# Altium schematic symbol library jlcpcb_2025_04_resistors_extended_0201.schlib: 1508 symbols (part 6 of 8)
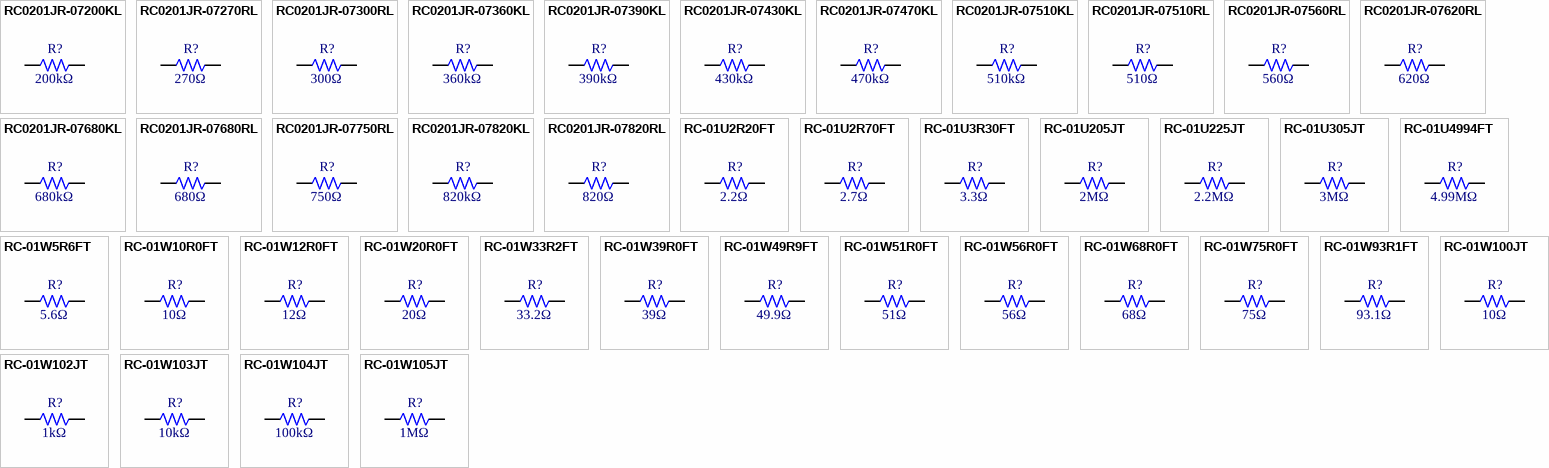
[diagram p42: symbols RC0201JR-07200KL to RC-01W105JT]

## RC-01U2R20FT
designator R?  Resistance: 2.2Ω  (hidden comment: *)
Resistor, 2.2Ω, ±1%, 50mW, ±400ppm/℃, -55℃~+125℃, SMD 0201; Manufacturer: Uniroyal; Manufacturer Part Number: RC-01U2R20FT; Supplier 1: LCSC; Supplier Part Number 1: C320468; JLCPCB Part Number: C320468; Power Rating: 50mW; Category: Resistors; Package Size: 0201; JLCPCB Basic Part: Yes; Tolerance: ±1%; Temperature Coefficient: ±400ppm/℃; Temperature Rating: -55℃~+125℃; ComponentLink1Description: Datasheet; ComponentLink1URL: https://wmsc.lcsc.com/wmsc/upload/file/pdf/v2/lcsc/2202211530_FH--Guangdong-Fenghua-Advanced-Tech-RC-01U2R20FT_C320468.pdf; ComponentLink2Description: JLCPCB Part URL; ComponentLink2URL: https://jlcpcb.com/partdetail/C320468
pins: 1, 2
1 alternate drawing of the same symbol

## RC-01U2R70FT
designator R?  Resistance: 2.7Ω  (hidden comment: *)
Resistor, 2.7Ω, ±1%, 50mW, 25V, ±400ppm/℃, -55℃~+155℃, SMD 0201; Manufacturer: Uniroyal; Manufacturer Part Number: RC-01U2R70FT; Supplier 1: LCSC; Supplier Part Number 1: C2991518; JLCPCB Part Number: C2991518; Power Rating: 50mW; Category: Resistors; Package Size: 0201; JLCPCB Basic Part: Yes; Tolerance: ±1%; Voltage Rating: 25V; Temperature Coefficient: ±400ppm/℃; Temperature Rating: -55℃~+155℃; ComponentLink1Description: Datasheet; ComponentLink1URL: https://wmsc.lcsc.com/wmsc/upload/file/pdf/v2/lcsc/2204111630_FH--Guangdong-Fenghua-Advanced-Tech-RC-01U2R70FT_C2991518.pdf; ComponentLink2Description: JLCPCB Part URL; ComponentLink2URL: https://jlcpcb.com/partdetail/C2991518
pins: 1, 2
1 alternate drawing of the same symbol

## RC-01U3R30FT
designator R?  Resistance: 3.3Ω  (hidden comment: *)
Resistor, 3.3Ω, ±1%, 50mW, 25V, ±400ppm/℃, -55℃~+125℃, SMD 0201; Manufacturer: Uniroyal; Manufacturer Part Number: RC-01U3R30FT; Supplier 1: LCSC; Supplier Part Number 1: C304495; JLCPCB Part Number: C304495; Power Rating: 50mW; Category: Resistors; Package Size: 0201; JLCPCB Basic Part: Yes; Tolerance: ±1%; Voltage Rating: 25V; Temperature Coefficient: ±400ppm/℃; Temperature Rating: -55℃~+125℃; ComponentLink1Description: Datasheet; ComponentLink1URL: https://wmsc.lcsc.com/wmsc/upload/file/pdf/v2/lcsc/2304140030_FH--Guangdong-Fenghua-Advanced-Tech-RC-01U3R30FT_C304495.pdf; ComponentLink2Description: JLCPCB Part URL; ComponentLink2URL: https://jlcpcb.com/partdetail/C304495
pins: 1, 2
1 alternate drawing of the same symbol

## RC-01U205JT
designator R?  Resistance: 2MΩ  (hidden comment: *)
Resistor, 2MΩ, ±5%, 50mW, 25V, ±400ppm/℃, -55℃~+125℃, SMD 0201; Manufacturer: Uniroyal; Manufacturer Part Number: RC-01U205JT; Supplier 1: LCSC; Supplier Part Number 1: C320464; JLCPCB Part Number: C320464; Power Rating: 50mW; Category: Resistors; Package Size: 0201; JLCPCB Basic Part: Yes; Tolerance: ±5%; Voltage Rating: 25V; Temperature Coefficient: ±400ppm/℃; Temperature Rating: -55℃~+125℃; ComponentLink1Description: Datasheet; ComponentLink1URL: https://wmsc.lcsc.com/wmsc/upload/file/pdf/v2/lcsc/2304140030_FH--Guangdong-Fenghua-Advanced-Tech-RC-01U205JT_C320464.pdf; ComponentLink2Description: JLCPCB Part URL; ComponentLink2URL: https://jlcpcb.com/partdetail/C320464
pins: 1, 2
1 alternate drawing of the same symbol

## RC-01U225JT
designator R?  Resistance: 2.2MΩ  (hidden comment: *)
Resistor, 2.2MΩ, ±5%, 50mW, 25V, ±400ppm/℃, -55℃~+125℃, SMD 0201; Manufacturer: Uniroyal; Manufacturer Part Number: RC-01U225JT; Supplier 1: LCSC; Supplier Part Number 1: C320465; JLCPCB Part Number: C320465; Power Rating: 50mW; Category: Resistors; Package Size: 0201; JLCPCB Basic Part: Yes; Tolerance: ±5%; Voltage Rating: 25V; Temperature Coefficient: ±400ppm/℃; Temperature Rating: -55℃~+125℃; ComponentLink1Description: Datasheet; ComponentLink1URL: https://wmsc.lcsc.com/wmsc/upload/file/pdf/v2/lcsc/2304140030_FH--Guangdong-Fenghua-Advanced-Tech-RC-01U225JT_C320465.pdf; ComponentLink2Description: JLCPCB Part URL; ComponentLink2URL: https://jlcpcb.com/partdetail/C320465
pins: 1, 2
1 alternate drawing of the same symbol

## RC-01U305JT
designator R?  Resistance: 3MΩ  (hidden comment: *)
Resistor, 3MΩ, ±5%, 50mW, 25V, ±400ppm/℃, -55℃~+125℃, SMD 0201; Manufacturer: Uniroyal; Manufacturer Part Number: RC-01U305JT; Supplier 1: LCSC; Supplier Part Number 1: C320473; JLCPCB Part Number: C320473; Power Rating: 50mW; Category: Resistors; Package Size: 0201; JLCPCB Basic Part: Yes; Tolerance: ±5%; Voltage Rating: 25V; Temperature Coefficient: ±400ppm/℃; Temperature Rating: -55℃~+125℃; ComponentLink1Description: Datasheet; ComponentLink1URL: https://wmsc.lcsc.com/wmsc/upload/file/pdf/v2/lcsc/2304140030_FH--Guangdong-Fenghua-Advanced-Tech-RC-01U305JT_C320473.pdf; ComponentLink2Description: JLCPCB Part URL; ComponentLink2URL: https://jlcpcb.com/partdetail/C320473
pins: 1, 2
1 alternate drawing of the same symbol

## RC-01U4994FT
designator R?  Resistance: 4.99MΩ  (hidden comment: *)
Resistor, 4.99MΩ, ±1%, 50mW, 25V, ±400ppm/℃, -55℃~+125℃, SMD 0201; Manufacturer: Uniroyal; Manufacturer Part Number: RC-01U4994FT; Supplier 1: LCSC; Supplier Part Number 1: C320480; JLCPCB Part Number: C320480; Power Rating: 50mW; Category: Resistors; Package Size: 0201; JLCPCB Basic Part: Yes; Tolerance: ±1%; Voltage Rating: 25V; Temperature Coefficient: ±400ppm/℃; Temperature Rating: -55℃~+125℃; ComponentLink1Description: Datasheet; ComponentLink1URL: https://wmsc.lcsc.com/wmsc/upload/file/pdf/v2/lcsc/2304140030_FH--Guangdong-Fenghua-Advanced-Tech-RC-01U4994FT_C320480.pdf; ComponentLink2Description: JLCPCB Part URL; ComponentLink2URL: https://jlcpcb.com/partdetail/C320480
pins: 1, 2
1 alternate drawing of the same symbol

## RC-01W5R6FT
designator R?  Resistance: 5.6Ω  (hidden comment: *)
Resistor, 5.6Ω, ±1%, 50mW, 25V, ±200ppm/℃, -55℃~+125℃, SMD 0201; Manufacturer: Uniroyal; Manufacturer Part Number: RC-01W5R6FT; Supplier 1: LCSC; Supplier Part Number 1: C304555; JLCPCB Part Number: C304555; Power Rating: 50mW; Category: Resistors; Package Size: 0201; JLCPCB Basic Part: Yes; Tolerance: ±1%; Voltage Rating: 25V; Temperature Coefficient: ±200ppm/℃; Temperature Rating: -55℃~+125℃; ComponentLink1Description: Datasheet; ComponentLink1URL: https://wmsc.lcsc.com/wmsc/upload/file/pdf/v2/lcsc/2304140030_FH--Guangdong-Fenghua-Advanced-Tech-RC-01W5R6FT_C304555.pdf; ComponentLink2Description: JLCPCB Part URL; ComponentLink2URL: https://jlcpcb.com/partdetail/C304555
pins: 1, 2
1 alternate drawing of the same symbol

## RC-01W10R0FT
designator R?  Resistance: 10Ω  (hidden comment: *)
Resistor, 10Ω, ±1%, 50mW, 25V, ±200ppm/℃, -55℃~+125℃, SMD 0201; Manufacturer: Uniroyal; Manufacturer Part Number: RC-01W10R0FT; Supplier 1: LCSC; Supplier Part Number 1: C304508; JLCPCB Part Number: C304508; Power Rating: 50mW; Category: Resistors; Package Size: 0201; JLCPCB Basic Part: Yes; Tolerance: ±1%; Voltage Rating: 25V; Temperature Coefficient: ±200ppm/℃; Temperature Rating: -55℃~+125℃; ComponentLink1Description: Datasheet; ComponentLink1URL: https://wmsc.lcsc.com/wmsc/upload/file/pdf/v2/lcsc/2304140030_FH--Guangdong-Fenghua-Advanced-Tech-RC-01W10R0FT_C304508.pdf; ComponentLink2Description: JLCPCB Part URL; ComponentLink2URL: https://jlcpcb.com/partdetail/C304508
pins: 1, 2
1 alternate drawing of the same symbol

## RC-01W12R0FT
designator R?  Resistance: 12Ω  (hidden comment: *)
Resistor, 12Ω, ±1%, 50mW, 25V, ±200ppm/℃, -55℃~+125℃, SMD 0201; Manufacturer: Uniroyal; Manufacturer Part Number: RC-01W12R0FT; Supplier 1: LCSC; Supplier Part Number 1: C304510; JLCPCB Part Number: C304510; Power Rating: 50mW; Category: Resistors; Package Size: 0201; JLCPCB Basic Part: Yes; Tolerance: ±1%; Voltage Rating: 25V; Temperature Coefficient: ±200ppm/℃; Temperature Rating: -55℃~+125℃; ComponentLink1Description: Datasheet; ComponentLink1URL: https://wmsc.lcsc.com/wmsc/upload/file/pdf/v2/lcsc/2304140030_FH--Guangdong-Fenghua-Advanced-Tech-RC-01W12R0FT_C304510.pdf; ComponentLink2Description: JLCPCB Part URL; ComponentLink2URL: https://jlcpcb.com/partdetail/C304510
pins: 1, 2
1 alternate drawing of the same symbol

## RC-01W20R0FT
designator R?  Resistance: 20Ω  (hidden comment: *)
Resistor, 20Ω, ±1%, 50mW, 25V, ±200ppm/℃, -55℃~+125℃, SMD 0201; Manufacturer: Uniroyal; Manufacturer Part Number: RC-01W20R0FT; Supplier 1: LCSC; Supplier Part Number 1: C320753; JLCPCB Part Number: C320753; Power Rating: 50mW; Category: Resistors; Package Size: 0201; JLCPCB Basic Part: Yes; Tolerance: ±1%; Voltage Rating: 25V; Temperature Coefficient: ±200ppm/℃; Temperature Rating: -55℃~+125℃; ComponentLink1Description: Datasheet; ComponentLink1URL: https://wmsc.lcsc.com/wmsc/upload/file/pdf/v2/lcsc/2304140030_FH--Guangdong-Fenghua-Advanced-Tech-RC-01W20R0FT_C320753.pdf; ComponentLink2Description: JLCPCB Part URL; ComponentLink2URL: https://jlcpcb.com/partdetail/C320753
pins: 1, 2
1 alternate drawing of the same symbol

## RC-01W33R2FT
designator R?  Resistance: 33.2Ω  (hidden comment: *)
Resistor, 33.2Ω, ±1%, 50mW, ±200ppm/℃, -55℃~+125℃, SMD 0201; Manufacturer: Uniroyal; Manufacturer Part Number: RC-01W33R2FT; Supplier 1: LCSC; Supplier Part Number 1: C320844; JLCPCB Part Number: C320844; Power Rating: 50mW; Category: Resistors; Package Size: 0201; JLCPCB Basic Part: Yes; Tolerance: ±1%; Temperature Coefficient: ±200ppm/℃; Temperature Rating: -55℃~+125℃; ComponentLink1Description: Datasheet; ComponentLink1URL: https://wmsc.lcsc.com/wmsc/upload/file/pdf/v2/lcsc/2202211530_FH--Guangdong-Fenghua-Advanced-Tech-RC-01W33R2FT_C320844.pdf; ComponentLink2Description: JLCPCB Part URL; ComponentLink2URL: https://jlcpcb.com/partdetail/C320844
pins: 1, 2
1 alternate drawing of the same symbol

## RC-01W39R0FT
designator R?  Resistance: 39Ω  (hidden comment: *)
Resistor, 39Ω, ±1%, 50mW, 25V, ±200ppm/℃, -55℃~+125℃, SMD 0201; Manufacturer: Uniroyal; Manufacturer Part Number: RC-01W39R0FT; Supplier 1: LCSC; Supplier Part Number 1: C320888; JLCPCB Part Number: C320888; Power Rating: 50mW; Category: Resistors; Package Size: 0201; JLCPCB Basic Part: Yes; Tolerance: ±1%; Voltage Rating: 25V; Temperature Coefficient: ±200ppm/℃; Temperature Rating: -55℃~+125℃; ComponentLink1Description: Datasheet; ComponentLink1URL: https://wmsc.lcsc.com/wmsc/upload/file/pdf/v2/lcsc/2304140030_FH--Guangdong-Fenghua-Advanced-Tech-RC-01W39R0FT_C320888.pdf; ComponentLink2Description: JLCPCB Part URL; ComponentLink2URL: https://jlcpcb.com/partdetail/C320888
pins: 1, 2
1 alternate drawing of the same symbol

## RC-01W49R9FT
designator R?  Resistance: 49.9Ω  (hidden comment: *)
Resistor, 49.9Ω, ±1%, 50mW, 25V, ±200ppm/℃, -55℃~+125℃, SMD 0201; Manufacturer: Uniroyal; Manufacturer Part Number: RC-01W49R9FT; Supplier 1: LCSC; Supplier Part Number 1: C304549; JLCPCB Part Number: C304549; Power Rating: 50mW; Category: Resistors; Package Size: 0201; JLCPCB Basic Part: Yes; Tolerance: ±1%; Voltage Rating: 25V; Temperature Coefficient: ±200ppm/℃; Temperature Rating: -55℃~+125℃; ComponentLink1Description: Datasheet; ComponentLink1URL: https://wmsc.lcsc.com/wmsc/upload/file/pdf/v2/lcsc/2304140030_FH--Guangdong-Fenghua-Advanced-Tech-RC-01W49R9FT_C304549.pdf; ComponentLink2Description: JLCPCB Part URL; ComponentLink2URL: https://jlcpcb.com/partdetail/C304549
pins: 1, 2
1 alternate drawing of the same symbol

## RC-01W51R0FT
designator R?  Resistance: 51Ω  (hidden comment: *)
Resistor, 51Ω, ±1%, 50mW, 25V, ±200ppm/℃, -55℃~+125℃, SMD 0201; Manufacturer: Uniroyal; Manufacturer Part Number: RC-01W51R0FT; Supplier 1: LCSC; Supplier Part Number 1: C320945; JLCPCB Part Number: C320945; Power Rating: 50mW; Category: Resistors; Package Size: 0201; JLCPCB Basic Part: Yes; Tolerance: ±1%; Voltage Rating: 25V; Temperature Coefficient: ±200ppm/℃; Temperature Rating: -55℃~+125℃; ComponentLink1Description: Datasheet; ComponentLink1URL: https://wmsc.lcsc.com/wmsc/upload/file/pdf/v2/lcsc/2304140030_FH--Guangdong-Fenghua-Advanced-Tech-RC-01W51R0FT_C320945.pdf; ComponentLink2Description: JLCPCB Part URL; ComponentLink2URL: https://jlcpcb.com/partdetail/C320945
pins: 1, 2
1 alternate drawing of the same symbol

## RC-01W56R0FT
designator R?  Resistance: 56Ω  (hidden comment: *)
Resistor, 56Ω, ±1%, 50mW, ±200ppm/℃, -55℃~+125℃, SMD 0201; Manufacturer: Uniroyal; Manufacturer Part Number: RC-01W56R0FT; Supplier 1: LCSC; Supplier Part Number 1: C320971; JLCPCB Part Number: C320971; Power Rating: 50mW; Category: Resistors; Package Size: 0201; JLCPCB Basic Part: Yes; Tolerance: ±1%; Temperature Coefficient: ±200ppm/℃; Temperature Rating: -55℃~+125℃; ComponentLink1Description: Datasheet; ComponentLink1URL: https://wmsc.lcsc.com/wmsc/upload/file/pdf/v2/lcsc/2110191430_FH--Guangdong-Fenghua-Advanced-Tech-RC-01W56R0FT_C320971.pdf; ComponentLink2Description: JLCPCB Part URL; ComponentLink2URL: https://jlcpcb.com/partdetail/C320971
pins: 1, 2
1 alternate drawing of the same symbol

## RC-01W68R0FT
designator R?  Resistance: 68Ω  (hidden comment: *)
Resistor, 68Ω, ±1%, 50mW, 25V, ±200ppm/℃, -55℃~+125℃, SMD 0201; Manufacturer: Uniroyal; Manufacturer Part Number: RC-01W68R0FT; Supplier 1: LCSC; Supplier Part Number 1: C304559; JLCPCB Part Number: C304559; Power Rating: 50mW; Category: Resistors; Package Size: 0201; JLCPCB Basic Part: Yes; Tolerance: ±1%; Voltage Rating: 25V; Temperature Coefficient: ±200ppm/℃; Temperature Rating: -55℃~+125℃; ComponentLink1Description: Datasheet; ComponentLink1URL: https://wmsc.lcsc.com/wmsc/upload/file/pdf/v2/lcsc/2304140030_FH--Guangdong-Fenghua-Advanced-Tech-RC-01W68R0FT_C304559.pdf; ComponentLink2Description: JLCPCB Part URL; ComponentLink2URL: https://jlcpcb.com/partdetail/C304559
pins: 1, 2
1 alternate drawing of the same symbol

## RC-01W75R0FT
designator R?  Resistance: 75Ω  (hidden comment: *)
Resistor, 75Ω, ±1%, 50mW, 25V, ±200ppm/℃, -55℃~+125℃, SMD 0201; Manufacturer: Uniroyal; Manufacturer Part Number: RC-01W75R0FT; Supplier 1: LCSC; Supplier Part Number 1: C321036; JLCPCB Part Number: C321036; Power Rating: 50mW; Category: Resistors; Package Size: 0201; JLCPCB Basic Part: Yes; Tolerance: ±1%; Voltage Rating: 25V; Temperature Coefficient: ±200ppm/℃; Temperature Rating: -55℃~+125℃; ComponentLink1Description: Datasheet; ComponentLink1URL: https://wmsc.lcsc.com/wmsc/upload/file/pdf/v2/lcsc/2304140030_FH--Guangdong-Fenghua-Advanced-Tech-RC-01W75R0FT_C321036.pdf; ComponentLink2Description: JLCPCB Part URL; ComponentLink2URL: https://jlcpcb.com/partdetail/C321036
pins: 1, 2
1 alternate drawing of the same symbol

## RC-01W93R1FT
designator R?  Resistance: 93.1Ω  (hidden comment: *)
Resistor, 93.1Ω, ±1%, ±200ppm/℃, SMD 0201; Manufacturer: Uniroyal; Manufacturer Part Number: RC-01W93R1FT; Supplier 1: LCSC; Supplier Part Number 1: C321096; JLCPCB Part Number: C321096; Category: Resistors; Package Size: 0201; JLCPCB Basic Part: Yes; Tolerance: ±1%; Temperature Coefficient: ±200ppm/℃; ComponentLink1Description: Datasheet; ComponentLink1URL: https://wmsc.lcsc.com/wmsc/upload/file/pdf/v2/lcsc/2204121100_FH--Guangdong-Fenghua-Advanced-Tech-RC-01W93R1FT_C321096.pdf; ComponentLink2Description: JLCPCB Part URL; ComponentLink2URL: https://jlcpcb.com/partdetail/C321096
pins: 1, 2
1 alternate drawing of the same symbol

## RC-01W100JT
designator R?  Resistance: 10Ω  (hidden comment: *)
Resistor, 10Ω, ±5%, 50mW, 25V, ±200ppm/℃, -55℃~+125℃, SMD 0201; Manufacturer: Uniroyal; Manufacturer Part Number: RC-01W100JT; Supplier 1: LCSC; Supplier Part Number 1: C320499; JLCPCB Part Number: C320499; Power Rating: 50mW; Category: Resistors; Package Size: 0201; JLCPCB Basic Part: Yes; Tolerance: ±5%; Voltage Rating: 25V; Temperature Coefficient: ±200ppm/℃; Temperature Rating: -55℃~+125℃; ComponentLink1Description: Datasheet; ComponentLink1URL: https://wmsc.lcsc.com/wmsc/upload/file/pdf/v2/lcsc/2304140030_FH--Guangdong-Fenghua-Advanced-Tech-RC-01W100JT_C320499.pdf; ComponentLink2Description: JLCPCB Part URL; ComponentLink2URL: https://jlcpcb.com/partdetail/C320499
pins: 1, 2
1 alternate drawing of the same symbol

## RC-01W102JT
designator R?  Resistance: 1kΩ  (hidden comment: *)
Resistor, 1kΩ, ±5%, 50mW, 25V, ±200ppm/℃, -55℃~+125℃, SMD 0201; Manufacturer: Uniroyal; Manufacturer Part Number: RC-01W102JT; Supplier 1: LCSC; Supplier Part Number 1: C304503; JLCPCB Part Number: C304503; Power Rating: 50mW; Category: Resistors; Package Size: 0201; JLCPCB Basic Part: Yes; Tolerance: ±5%; Voltage Rating: 25V; Temperature Coefficient: ±200ppm/℃; Temperature Rating: -55℃~+125℃; ComponentLink1Description: Datasheet; ComponentLink1URL: https://wmsc.lcsc.com/wmsc/upload/file/pdf/v2/lcsc/2304140030_FH--Guangdong-Fenghua-Advanced-Tech-RC-01W102JT_C304503.pdf; ComponentLink2Description: JLCPCB Part URL; ComponentLink2URL: https://jlcpcb.com/partdetail/C304503
pins: 1, 2
1 alternate drawing of the same symbol

## RC-01W103JT
designator R?  Resistance: 10kΩ  (hidden comment: *)
Resistor, 10kΩ, ±5%, 50mW, 25V, ±200ppm/℃, -55℃~+125℃, SMD 0201; Manufacturer: Uniroyal; Manufacturer Part Number: RC-01W103JT; Supplier 1: LCSC; Supplier Part Number 1: C304504; JLCPCB Part Number: C304504; Power Rating: 50mW; Category: Resistors; Package Size: 0201; JLCPCB Basic Part: Yes; Tolerance: ±5%; Voltage Rating: 25V; Temperature Coefficient: ±200ppm/℃; Temperature Rating: -55℃~+125℃; ComponentLink1Description: Datasheet; ComponentLink1URL: https://wmsc.lcsc.com/wmsc/upload/file/pdf/v2/lcsc/2304140030_FH--Guangdong-Fenghua-Advanced-Tech-RC-01W103JT_C304504.pdf; ComponentLink2Description: JLCPCB Part URL; ComponentLink2URL: https://jlcpcb.com/partdetail/C304504
pins: 1, 2
1 alternate drawing of the same symbol

## RC-01W104JT
designator R?  Resistance: 100kΩ  (hidden comment: *)
Resistor, 100kΩ, ±5%, 50mW, 25V, ±200ppm/℃, -55℃~+125℃, SMD 0201; Manufacturer: Uniroyal; Manufacturer Part Number: RC-01W104JT; Supplier 1: LCSC; Supplier Part Number 1: C304505; JLCPCB Part Number: C304505; Power Rating: 50mW; Category: Resistors; Package Size: 0201; JLCPCB Basic Part: Yes; Tolerance: ±5%; Voltage Rating: 25V; Temperature Coefficient: ±200ppm/℃; Temperature Rating: -55℃~+125℃; ComponentLink1Description: Datasheet; ComponentLink1URL: https://wmsc.lcsc.com/wmsc/upload/file/pdf/v2/lcsc/2304140030_FH--Guangdong-Fenghua-Advanced-Tech-RC-01W104JT_C304505.pdf; ComponentLink2Description: JLCPCB Part URL; ComponentLink2URL: https://jlcpcb.com/partdetail/C304505
pins: 1, 2
1 alternate drawing of the same symbol

## RC-01W105JT
designator R?  Resistance: 1MΩ  (hidden comment: *)
Resistor, 1MΩ, ±5%, 50mW, 25V, ±200ppm/℃, -55℃~+125℃, SMD 0201; Manufacturer: Uniroyal; Manufacturer Part Number: RC-01W105JT; Supplier 1: LCSC; Supplier Part Number 1: C304507; JLCPCB Part Number: C304507; Power Rating: 50mW; Category: Resistors; Package Size: 0201; JLCPCB Basic Part: Yes; Tolerance: ±5%; Voltage Rating: 25V; Temperature Coefficient: ±200ppm/℃; Temperature Rating: -55℃~+125℃; ComponentLink1Description: Datasheet; ComponentLink1URL: https://wmsc.lcsc.com/wmsc/upload/file/pdf/v2/lcsc/2304140030_FH--Guangdong-Fenghua-Advanced-Tech-RC-01W105JT_C304507.pdf; ComponentLink2Description: JLCPCB Part URL; ComponentLink2URL: https://jlcpcb.com/partdetail/C304507
pins: 1, 2
1 alternate drawing of the same symbol

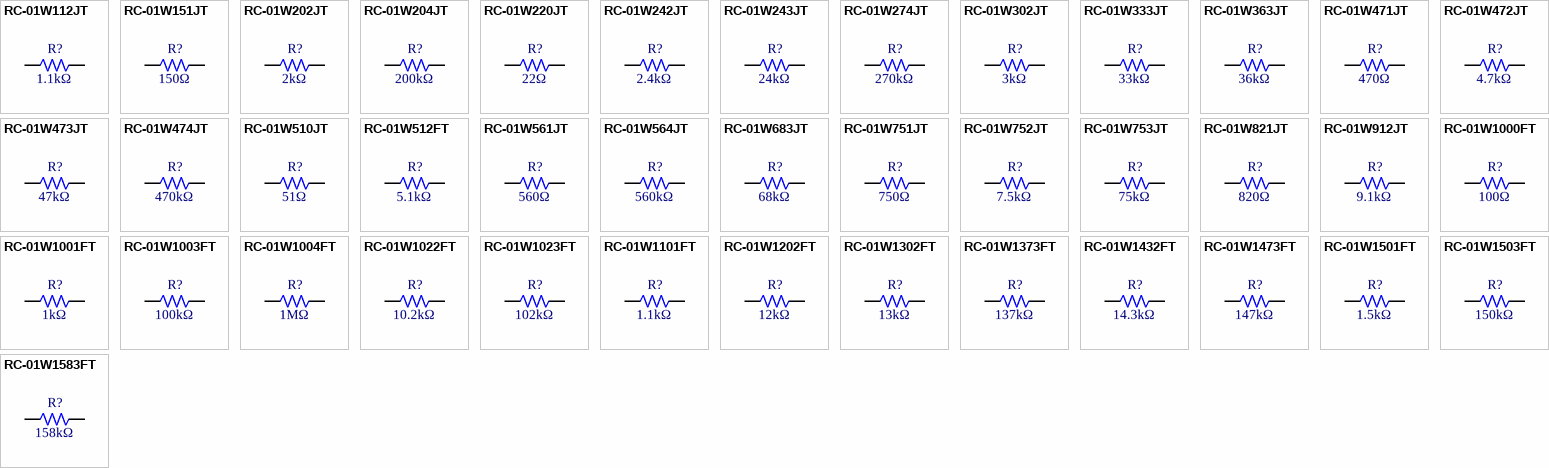
[diagram p25: symbols RC-01W112JT to RC-01W1583FT]

## RC-01W112JT
designator R?  Resistance: 1.1kΩ  (hidden comment: *)
Resistor, 1.1kΩ, ±5%, 50mW, 25V, ±200ppm/℃, -55℃~+125℃, SMD 0201; Manufacturer: Uniroyal; Manufacturer Part Number: RC-01W112JT; Supplier 1: LCSC; Supplier Part Number 1: C320512; JLCPCB Part Number: C320512; Power Rating: 50mW; Category: Resistors; Package Size: 0201; JLCPCB Basic Part: Yes; Tolerance: ±5%; Voltage Rating: 25V; Temperature Coefficient: ±200ppm/℃; Temperature Rating: -55℃~+125℃; ComponentLink1Description: Datasheet; ComponentLink1URL: https://wmsc.lcsc.com/wmsc/upload/file/pdf/v2/lcsc/2304140030_FH--Guangdong-Fenghua-Advanced-Tech-RC-01W112JT_C320512.pdf; ComponentLink2Description: JLCPCB Part URL; ComponentLink2URL: https://jlcpcb.com/partdetail/C320512
pins: 1, 2
1 alternate drawing of the same symbol

## RC-01W151JT
designator R?  Resistance: 150Ω  (hidden comment: *)
Resistor, 150Ω, ±5%, 50mW, 25V, ±200ppm/℃, -55℃~+125℃, SMD 0201; Manufacturer: Uniroyal; Manufacturer Part Number: RC-01W151JT; Supplier 1: LCSC; Supplier Part Number 1: C304513; JLCPCB Part Number: C304513; Power Rating: 50mW; Category: Resistors; Package Size: 0201; JLCPCB Basic Part: Yes; Tolerance: ±5%; Voltage Rating: 25V; Temperature Coefficient: ±200ppm/℃; Temperature Rating: -55℃~+125℃; ComponentLink1Description: Datasheet; ComponentLink1URL: https://wmsc.lcsc.com/wmsc/upload/file/pdf/v2/lcsc/2304140030_FH--Guangdong-Fenghua-Advanced-Tech-RC-01W151JT_C304513.pdf; ComponentLink2Description: JLCPCB Part URL; ComponentLink2URL: https://jlcpcb.com/partdetail/C304513
pins: 1, 2
1 alternate drawing of the same symbol

## RC-01W202JT
designator R?  Resistance: 2kΩ  (hidden comment: *)
Resistor, 2kΩ, ±5%, 50mW, 25V, ±200ppm/℃, -55℃~+125℃, SMD 0201; Manufacturer: Uniroyal; Manufacturer Part Number: RC-01W202JT; Supplier 1: LCSC; Supplier Part Number 1: C304518; JLCPCB Part Number: C304518; Power Rating: 50mW; Category: Resistors; Package Size: 0201; JLCPCB Basic Part: Yes; Tolerance: ±5%; Voltage Rating: 25V; Temperature Coefficient: ±200ppm/℃; Temperature Rating: -55℃~+125℃; ComponentLink1Description: Datasheet; ComponentLink1URL: https://wmsc.lcsc.com/wmsc/upload/file/pdf/v2/lcsc/2304140030_FH--Guangdong-Fenghua-Advanced-Tech-RC-01W202JT_C304518.pdf; ComponentLink2Description: JLCPCB Part URL; ComponentLink2URL: https://jlcpcb.com/partdetail/C304518
pins: 1, 2
1 alternate drawing of the same symbol

## RC-01W204JT
designator R?  Resistance: 200kΩ  (hidden comment: *)
Resistor, 200kΩ, ±5%, 50mW, 25V, ±200ppm/℃, -55℃~+125℃, SMD 0201; Manufacturer: Uniroyal; Manufacturer Part Number: RC-01W204JT; Supplier 1: LCSC; Supplier Part Number 1: C304519; JLCPCB Part Number: C304519; Power Rating: 50mW; Category: Resistors; Package Size: 0201; JLCPCB Basic Part: Yes; Tolerance: ±5%; Voltage Rating: 25V; Temperature Coefficient: ±200ppm/℃; Temperature Rating: -55℃~+125℃; ComponentLink1Description: Datasheet; ComponentLink1URL: https://wmsc.lcsc.com/wmsc/upload/file/pdf/v2/lcsc/2304140030_FH--Guangdong-Fenghua-Advanced-Tech-RC-01W204JT_C304519.pdf; ComponentLink2Description: JLCPCB Part URL; ComponentLink2URL: https://jlcpcb.com/partdetail/C304519
pins: 1, 2
1 alternate drawing of the same symbol

## RC-01W220JT
designator R?  Resistance: 22Ω  (hidden comment: *)
Resistor, 22Ω, ±5%, 50mW, 25V, ±200ppm/℃, -55℃~+125℃, SMD 0201; Manufacturer: Uniroyal; Manufacturer Part Number: RC-01W220JT; Supplier 1: LCSC; Supplier Part Number 1: C304520; JLCPCB Part Number: C304520; Power Rating: 50mW; Category: Resistors; Package Size: 0201; JLCPCB Basic Part: Yes; Tolerance: ±5%; Voltage Rating: 25V; Temperature Coefficient: ±200ppm/℃; Temperature Rating: -55℃~+125℃; ComponentLink1Description: Datasheet; ComponentLink1URL: https://wmsc.lcsc.com/wmsc/upload/file/pdf/v2/lcsc/2304140030_FH--Guangdong-Fenghua-Advanced-Tech-RC-01W220JT_C304520.pdf; ComponentLink2Description: JLCPCB Part URL; ComponentLink2URL: https://jlcpcb.com/partdetail/C304520
pins: 1, 2
1 alternate drawing of the same symbol

## RC-01W242JT
designator R?  Resistance: 2.4kΩ  (hidden comment: *)
Resistor, 2.4kΩ, ±5%, 50mW, 25V, ±200ppm/℃, -55℃~+125℃, SMD 0201; Manufacturer: Uniroyal; Manufacturer Part Number: RC-01W242JT; Supplier 1: LCSC; Supplier Part Number 1: C320777; JLCPCB Part Number: C320777; Power Rating: 50mW; Category: Resistors; Package Size: 0201; JLCPCB Basic Part: Yes; Tolerance: ±5%; Voltage Rating: 25V; Temperature Coefficient: ±200ppm/℃; Temperature Rating: -55℃~+125℃; ComponentLink1Description: Datasheet; ComponentLink1URL: https://wmsc.lcsc.com/wmsc/upload/file/pdf/v2/lcsc/2304140030_FH--Guangdong-Fenghua-Advanced-Tech-RC-01W242JT_C320777.pdf; ComponentLink2Description: JLCPCB Part URL; ComponentLink2URL: https://jlcpcb.com/partdetail/C320777
pins: 1, 2
1 alternate drawing of the same symbol

## RC-01W243JT
designator R?  Resistance: 24kΩ  (hidden comment: *)
Resistor, 24kΩ, ±5%, 50mW, 25V, ±200ppm/℃, -55℃~+125℃, SMD 0201; Manufacturer: Uniroyal; Manufacturer Part Number: RC-01W243JT; Supplier 1: LCSC; Supplier Part Number 1: C304525; JLCPCB Part Number: C304525; Power Rating: 50mW; Category: Resistors; Package Size: 0201; JLCPCB Basic Part: Yes; Tolerance: ±5%; Voltage Rating: 25V; Temperature Coefficient: ±200ppm/℃; Temperature Rating: -55℃~+125℃; ComponentLink1Description: Datasheet; ComponentLink1URL: https://wmsc.lcsc.com/wmsc/upload/file/pdf/v2/lcsc/2304140030_FH--Guangdong-Fenghua-Advanced-Tech-RC-01W243JT_C304525.pdf; ComponentLink2Description: JLCPCB Part URL; ComponentLink2URL: https://jlcpcb.com/partdetail/C304525
pins: 1, 2
1 alternate drawing of the same symbol

## RC-01W274JT
designator R?  Resistance: 270kΩ  (hidden comment: *)
Resistor, 270kΩ, ±5%, 50mW, 25V, ±200ppm/℃, -55℃~+125℃, SMD 0201; Manufacturer: Uniroyal; Manufacturer Part Number: RC-01W274JT; Supplier 1: LCSC; Supplier Part Number 1: C320802; JLCPCB Part Number: C320802; Power Rating: 50mW; Category: Resistors; Package Size: 0201; JLCPCB Basic Part: Yes; Tolerance: ±5%; Voltage Rating: 25V; Temperature Coefficient: ±200ppm/℃; Temperature Rating: -55℃~+125℃; ComponentLink1Description: Datasheet; ComponentLink1URL: https://wmsc.lcsc.com/wmsc/upload/file/pdf/v2/lcsc/2304140030_FH--Guangdong-Fenghua-Advanced-Tech-RC-01W274JT_C320802.pdf; ComponentLink2Description: JLCPCB Part URL; ComponentLink2URL: https://jlcpcb.com/partdetail/C320802
pins: 1, 2
1 alternate drawing of the same symbol

## RC-01W302JT
designator R?  Resistance: 3kΩ  (hidden comment: *)
Resistor, 3kΩ, ±5%, 50mW, 25V, ±200ppm/℃, -55℃~+125℃, SMD 0201; Manufacturer: Uniroyal; Manufacturer Part Number: RC-01W302JT; Supplier 1: LCSC; Supplier Part Number 1: C304528; JLCPCB Part Number: C304528; Power Rating: 50mW; Category: Resistors; Package Size: 0201; JLCPCB Basic Part: Yes; Tolerance: ±5%; Voltage Rating: 25V; Temperature Coefficient: ±200ppm/℃; Temperature Rating: -55℃~+125℃; ComponentLink1Description: Datasheet; ComponentLink1URL: https://wmsc.lcsc.com/wmsc/upload/file/pdf/v2/lcsc/2304140030_FH--Guangdong-Fenghua-Advanced-Tech-RC-01W302JT_C304528.pdf; ComponentLink2Description: JLCPCB Part URL; ComponentLink2URL: https://jlcpcb.com/partdetail/C304528
pins: 1, 2
1 alternate drawing of the same symbol

## RC-01W333JT
designator R?  Resistance: 33kΩ  (hidden comment: *)
Resistor, 33kΩ, ±5%, 50mW, 25V, ±200ppm/℃, -55℃~+125℃, SMD 0201; Manufacturer: Uniroyal; Manufacturer Part Number: RC-01W333JT; Supplier 1: LCSC; Supplier Part Number 1: C320841; JLCPCB Part Number: C320841; Power Rating: 50mW; Category: Resistors; Package Size: 0201; JLCPCB Basic Part: Yes; Tolerance: ±5%; Voltage Rating: 25V; Temperature Coefficient: ±200ppm/℃; Temperature Rating: -55℃~+125℃; ComponentLink1Description: Datasheet; ComponentLink1URL: https://wmsc.lcsc.com/wmsc/upload/file/pdf/v2/lcsc/2304140030_FH--Guangdong-Fenghua-Advanced-Tech-RC-01W333JT_C320841.pdf; ComponentLink2Description: JLCPCB Part URL; ComponentLink2URL: https://jlcpcb.com/partdetail/C320841
pins: 1, 2
1 alternate drawing of the same symbol

## RC-01W363JT
designator R?  Resistance: 36kΩ  (hidden comment: *)
Resistor, 36kΩ, ±5%, 50mW, 25V, ±200ppm/℃, -55℃~+125℃, SMD 0201; Manufacturer: Uniroyal; Manufacturer Part Number: RC-01W363JT; Supplier 1: LCSC; Supplier Part Number 1: C320866; JLCPCB Part Number: C320866; Power Rating: 50mW; Category: Resistors; Package Size: 0201; JLCPCB Basic Part: Yes; Tolerance: ±5%; Voltage Rating: 25V; Temperature Coefficient: ±200ppm/℃; Temperature Rating: -55℃~+125℃; ComponentLink1Description: Datasheet; ComponentLink1URL: https://wmsc.lcsc.com/wmsc/upload/file/pdf/v2/lcsc/2304140030_FH--Guangdong-Fenghua-Advanced-Tech-RC-01W363JT_C320866.pdf; ComponentLink2Description: JLCPCB Part URL; ComponentLink2URL: https://jlcpcb.com/partdetail/C320866
pins: 1, 2
1 alternate drawing of the same symbol

## RC-01W471JT
designator R?  Resistance: 470Ω  (hidden comment: *)
Resistor, 470Ω, ±5%, 50mW, 25V, ±200ppm/℃, -55℃~+125℃, SMD 0201; Manufacturer: Uniroyal; Manufacturer Part Number: RC-01W471JT; Supplier 1: LCSC; Supplier Part Number 1: C304545; JLCPCB Part Number: C304545; Power Rating: 50mW; Category: Resistors; Package Size: 0201; JLCPCB Basic Part: Yes; Tolerance: ±5%; Voltage Rating: 25V; Temperature Coefficient: ±200ppm/℃; Temperature Rating: -55℃~+125℃; ComponentLink1Description: Datasheet; ComponentLink1URL: https://wmsc.lcsc.com/wmsc/upload/file/pdf/v2/lcsc/2304140030_FH--Guangdong-Fenghua-Advanced-Tech-RC-01W471JT_C304545.pdf; ComponentLink2Description: JLCPCB Part URL; ComponentLink2URL: https://jlcpcb.com/partdetail/C304545
pins: 1, 2
1 alternate drawing of the same symbol

## RC-01W472JT
designator R?  Resistance: 4.7kΩ  (hidden comment: *)
Resistor, 4.7kΩ, ±5%, 50mW, 25V, ±200ppm/℃, -55℃~+125℃, SMD 0201; Manufacturer: Uniroyal; Manufacturer Part Number: RC-01W472JT; Supplier 1: LCSC; Supplier Part Number 1: C304546; JLCPCB Part Number: C304546; Power Rating: 50mW; Category: Resistors; Package Size: 0201; JLCPCB Basic Part: Yes; Tolerance: ±5%; Voltage Rating: 25V; Temperature Coefficient: ±200ppm/℃; Temperature Rating: -55℃~+125℃; ComponentLink1Description: Datasheet; ComponentLink1URL: https://wmsc.lcsc.com/wmsc/upload/file/pdf/v2/lcsc/2304140030_FH--Guangdong-Fenghua-Advanced-Tech-RC-01W472JT_C304546.pdf; ComponentLink2Description: JLCPCB Part URL; ComponentLink2URL: https://jlcpcb.com/partdetail/C304546
pins: 1, 2
1 alternate drawing of the same symbol

## RC-01W473JT
designator R?  Resistance: 47kΩ  (hidden comment: *)
Resistor, 47kΩ, ±5%, 50mW, 25V, ±200ppm/℃, -55℃~+125℃, SMD 0201; Manufacturer: Uniroyal; Manufacturer Part Number: RC-01W473JT; Supplier 1: LCSC; Supplier Part Number 1: C304547; JLCPCB Part Number: C304547; Power Rating: 50mW; Category: Resistors; Package Size: 0201; JLCPCB Basic Part: Yes; Tolerance: ±5%; Voltage Rating: 25V; Temperature Coefficient: ±200ppm/℃; Temperature Rating: -55℃~+125℃; ComponentLink1Description: Datasheet; ComponentLink1URL: https://wmsc.lcsc.com/wmsc/upload/file/pdf/v2/lcsc/2304140030_FH--Guangdong-Fenghua-Advanced-Tech-RC-01W473JT_C304547.pdf; ComponentLink2Description: JLCPCB Part URL; ComponentLink2URL: https://jlcpcb.com/partdetail/C304547
pins: 1, 2
1 alternate drawing of the same symbol

## RC-01W474JT
designator R?  Resistance: 470kΩ  (hidden comment: *)
Resistor, 470kΩ, ±5%, 50mW, 25V, ±200ppm/℃, -55℃~+125℃, SMD 0201; Manufacturer: Uniroyal; Manufacturer Part Number: RC-01W474JT; Supplier 1: LCSC; Supplier Part Number 1: C304548; JLCPCB Part Number: C304548; Power Rating: 50mW; Category: Resistors; Package Size: 0201; JLCPCB Basic Part: Yes; Tolerance: ±5%; Voltage Rating: 25V; Temperature Coefficient: ±200ppm/℃; Temperature Rating: -55℃~+125℃; ComponentLink1Description: Datasheet; ComponentLink1URL: https://wmsc.lcsc.com/wmsc/upload/file/pdf/v2/lcsc/2304140030_FH--Guangdong-Fenghua-Advanced-Tech-RC-01W474JT_C304548.pdf; ComponentLink2Description: JLCPCB Part URL; ComponentLink2URL: https://jlcpcb.com/partdetail/C304548
pins: 1, 2
1 alternate drawing of the same symbol

## RC-01W510JT
designator R?  Resistance: 51Ω  (hidden comment: *)
Resistor, 51Ω, ±5%, 50mW, 25V, ±200ppm/℃, -55℃~+125℃, SMD 0201; Manufacturer: Uniroyal; Manufacturer Part Number: RC-01W510JT; Supplier 1: LCSC; Supplier Part Number 1: C304551; JLCPCB Part Number: C304551; Power Rating: 50mW; Category: Resistors; Package Size: 0201; JLCPCB Basic Part: Yes; Tolerance: ±5%; Voltage Rating: 25V; Temperature Coefficient: ±200ppm/℃; Temperature Rating: -55℃~+125℃; ComponentLink1Description: Datasheet; ComponentLink1URL: https://wmsc.lcsc.com/wmsc/upload/file/pdf/v2/lcsc/2304140030_FH--Guangdong-Fenghua-Advanced-Tech-RC-01W510JT_C304551.pdf; ComponentLink2Description: JLCPCB Part URL; ComponentLink2URL: https://jlcpcb.com/partdetail/C304551
pins: 1, 2
1 alternate drawing of the same symbol

## RC-01W512FT
designator R?  Resistance: 5.1kΩ  (hidden comment: *)
Resistor, 5.1kΩ, ±1%, 50mW, 25V, ±200ppm/℃, -55℃~+125℃, SMD 0201; Manufacturer: Uniroyal; Manufacturer Part Number: RC-01W512FT; Supplier 1: LCSC; Supplier Part Number 1: C304552; JLCPCB Part Number: C304552; Power Rating: 50mW; Category: Resistors; Package Size: 0201; JLCPCB Basic Part: Yes; Tolerance: ±1%; Voltage Rating: 25V; Temperature Coefficient: ±200ppm/℃; Temperature Rating: -55℃~+125℃; ComponentLink1Description: Datasheet; ComponentLink1URL: https://wmsc.lcsc.com/wmsc/upload/file/pdf/v2/lcsc/2304140030_FH--Guangdong-Fenghua-Advanced-Tech-RC-01W512FT_C304552.pdf; ComponentLink2Description: JLCPCB Part URL; ComponentLink2URL: https://jlcpcb.com/partdetail/C304552
pins: 1, 2
1 alternate drawing of the same symbol

## RC-01W561JT
designator R?  Resistance: 560Ω  (hidden comment: *)
Resistor, 560Ω, ±5%, 50mW, 25V, ±200ppm/℃, -55℃~+125℃, SMD 0201; Manufacturer: Uniroyal; Manufacturer Part Number: RC-01W561JT; Supplier 1: LCSC; Supplier Part Number 1: C320963; JLCPCB Part Number: C320963; Power Rating: 50mW; Category: Resistors; Package Size: 0201; JLCPCB Basic Part: Yes; Tolerance: ±5%; Voltage Rating: 25V; Temperature Coefficient: ±200ppm/℃; Temperature Rating: -55℃~+125℃; ComponentLink1Description: Datasheet; ComponentLink1URL: https://wmsc.lcsc.com/wmsc/upload/file/pdf/v2/lcsc/2304140030_FH--Guangdong-Fenghua-Advanced-Tech-RC-01W561JT_C320963.pdf; ComponentLink2Description: JLCPCB Part URL; ComponentLink2URL: https://jlcpcb.com/partdetail/C320963
pins: 1, 2
1 alternate drawing of the same symbol

## RC-01W564JT
designator R?  Resistance: 560kΩ  (hidden comment: *)
Resistor, 560kΩ, ±5%, 50mW, 25V, ±200ppm/℃, -55℃~+125℃, SMD 0201; Manufacturer: Uniroyal; Manufacturer Part Number: RC-01W564JT; Supplier 1: LCSC; Supplier Part Number 1: C320970; JLCPCB Part Number: C320970; Power Rating: 50mW; Category: Resistors; Package Size: 0201; JLCPCB Basic Part: Yes; Tolerance: ±5%; Voltage Rating: 25V; Temperature Coefficient: ±200ppm/℃; Temperature Rating: -55℃~+125℃; ComponentLink1Description: Datasheet; ComponentLink1URL: https://wmsc.lcsc.com/wmsc/upload/file/pdf/v2/lcsc/2304140030_FH--Guangdong-Fenghua-Advanced-Tech-RC-01W564JT_C320970.pdf; ComponentLink2Description: JLCPCB Part URL; ComponentLink2URL: https://jlcpcb.com/partdetail/C320970
pins: 1, 2
1 alternate drawing of the same symbol

## RC-01W683JT
designator R?  Resistance: 68kΩ  (hidden comment: *)
Resistor, 68kΩ, ±5%, 50mW, 25V, ±200ppm/℃, -55℃~+125℃, SMD 0201; Manufacturer: Uniroyal; Manufacturer Part Number: RC-01W683JT; Supplier 1: LCSC; Supplier Part Number 1: C321015; JLCPCB Part Number: C321015; Power Rating: 50mW; Category: Resistors; Package Size: 0201; JLCPCB Basic Part: Yes; Tolerance: ±5%; Voltage Rating: 25V; Temperature Coefficient: ±200ppm/℃; Temperature Rating: -55℃~+125℃; ComponentLink1Description: Datasheet; ComponentLink1URL: https://wmsc.lcsc.com/wmsc/upload/file/pdf/v2/lcsc/2304140030_FH--Guangdong-Fenghua-Advanced-Tech-RC-01W683JT_C321015.pdf; ComponentLink2Description: JLCPCB Part URL; ComponentLink2URL: https://jlcpcb.com/partdetail/C321015
pins: 1, 2
1 alternate drawing of the same symbol

## RC-01W751JT
designator R?  Resistance: 750Ω  (hidden comment: *)
Resistor, 750Ω, ±5%, 50mW, 25V, ±200ppm/℃, -55℃~+125℃, SMD 0201; Manufacturer: Uniroyal; Manufacturer Part Number: RC-01W751JT; Supplier 1: LCSC; Supplier Part Number 1: C321033; JLCPCB Part Number: C321033; Power Rating: 50mW; Category: Resistors; Package Size: 0201; JLCPCB Basic Part: Yes; Tolerance: ±5%; Voltage Rating: 25V; Temperature Coefficient: ±200ppm/℃; Temperature Rating: -55℃~+125℃; ComponentLink1Description: Datasheet; ComponentLink1URL: https://wmsc.lcsc.com/wmsc/upload/file/pdf/v2/lcsc/2304140030_FH--Guangdong-Fenghua-Advanced-Tech-RC-01W751JT_C321033.pdf; ComponentLink2Description: JLCPCB Part URL; ComponentLink2URL: https://jlcpcb.com/partdetail/C321033
pins: 1, 2
1 alternate drawing of the same symbol

## RC-01W752JT
designator R?  Resistance: 7.5kΩ  (hidden comment: *)
Resistor, 7.5kΩ, ±5%, 50mW, 25V, ±200ppm/℃, -55℃~+125℃, SMD 0201; Manufacturer: Uniroyal; Manufacturer Part Number: RC-01W752JT; Supplier 1: LCSC; Supplier Part Number 1: C321034; JLCPCB Part Number: C321034; Power Rating: 50mW; Category: Resistors; Package Size: 0201; JLCPCB Basic Part: Yes; Tolerance: ±5%; Voltage Rating: 25V; Temperature Coefficient: ±200ppm/℃; Temperature Rating: -55℃~+125℃; ComponentLink1Description: Datasheet; ComponentLink1URL: https://wmsc.lcsc.com/wmsc/upload/file/pdf/v2/lcsc/2304140030_FH--Guangdong-Fenghua-Advanced-Tech-RC-01W752JT_C321034.pdf; ComponentLink2Description: JLCPCB Part URL; ComponentLink2URL: https://jlcpcb.com/partdetail/C321034
pins: 1, 2
1 alternate drawing of the same symbol

## RC-01W753JT
designator R?  Resistance: 75kΩ  (hidden comment: *)
Resistor, 75kΩ, ±5%, 50mW, 25V, ±200ppm/℃, -55℃~+125℃, SMD 0201; Manufacturer: Uniroyal; Manufacturer Part Number: RC-01W753JT; Supplier 1: LCSC; Supplier Part Number 1: C321035; JLCPCB Part Number: C321035; Power Rating: 50mW; Category: Resistors; Package Size: 0201; JLCPCB Basic Part: Yes; Tolerance: ±5%; Voltage Rating: 25V; Temperature Coefficient: ±200ppm/℃; Temperature Rating: -55℃~+125℃; ComponentLink1Description: Datasheet; ComponentLink1URL: https://wmsc.lcsc.com/wmsc/upload/file/pdf/v2/lcsc/2304140030_FH--Guangdong-Fenghua-Advanced-Tech-RC-01W753JT_C321035.pdf; ComponentLink2Description: JLCPCB Part URL; ComponentLink2URL: https://jlcpcb.com/partdetail/C321035
pins: 1, 2
1 alternate drawing of the same symbol

## RC-01W821JT
designator R?  Resistance: 820Ω  (hidden comment: *)
Resistor, 820Ω, ±5%, 50mW, 25V, ±200ppm/℃, -55℃~+125℃, SMD 0201; Manufacturer: Uniroyal; Manufacturer Part Number: RC-01W821JT; Supplier 1: LCSC; Supplier Part Number 1: C321055; JLCPCB Part Number: C321055; Power Rating: 50mW; Category: Resistors; Package Size: 0201; JLCPCB Basic Part: Yes; Tolerance: ±5%; Voltage Rating: 25V; Temperature Coefficient: ±200ppm/℃; Temperature Rating: -55℃~+125℃; ComponentLink1Description: Datasheet; ComponentLink1URL: https://wmsc.lcsc.com/wmsc/upload/file/pdf/v2/lcsc/2304140030_FH--Guangdong-Fenghua-Advanced-Tech-RC-01W821JT_C321055.pdf; ComponentLink2Description: JLCPCB Part URL; ComponentLink2URL: https://jlcpcb.com/partdetail/C321055
pins: 1, 2
1 alternate drawing of the same symbol
